# Altium schematic symbol library IC.SchLib: 555 symbols (part 5 of 15)
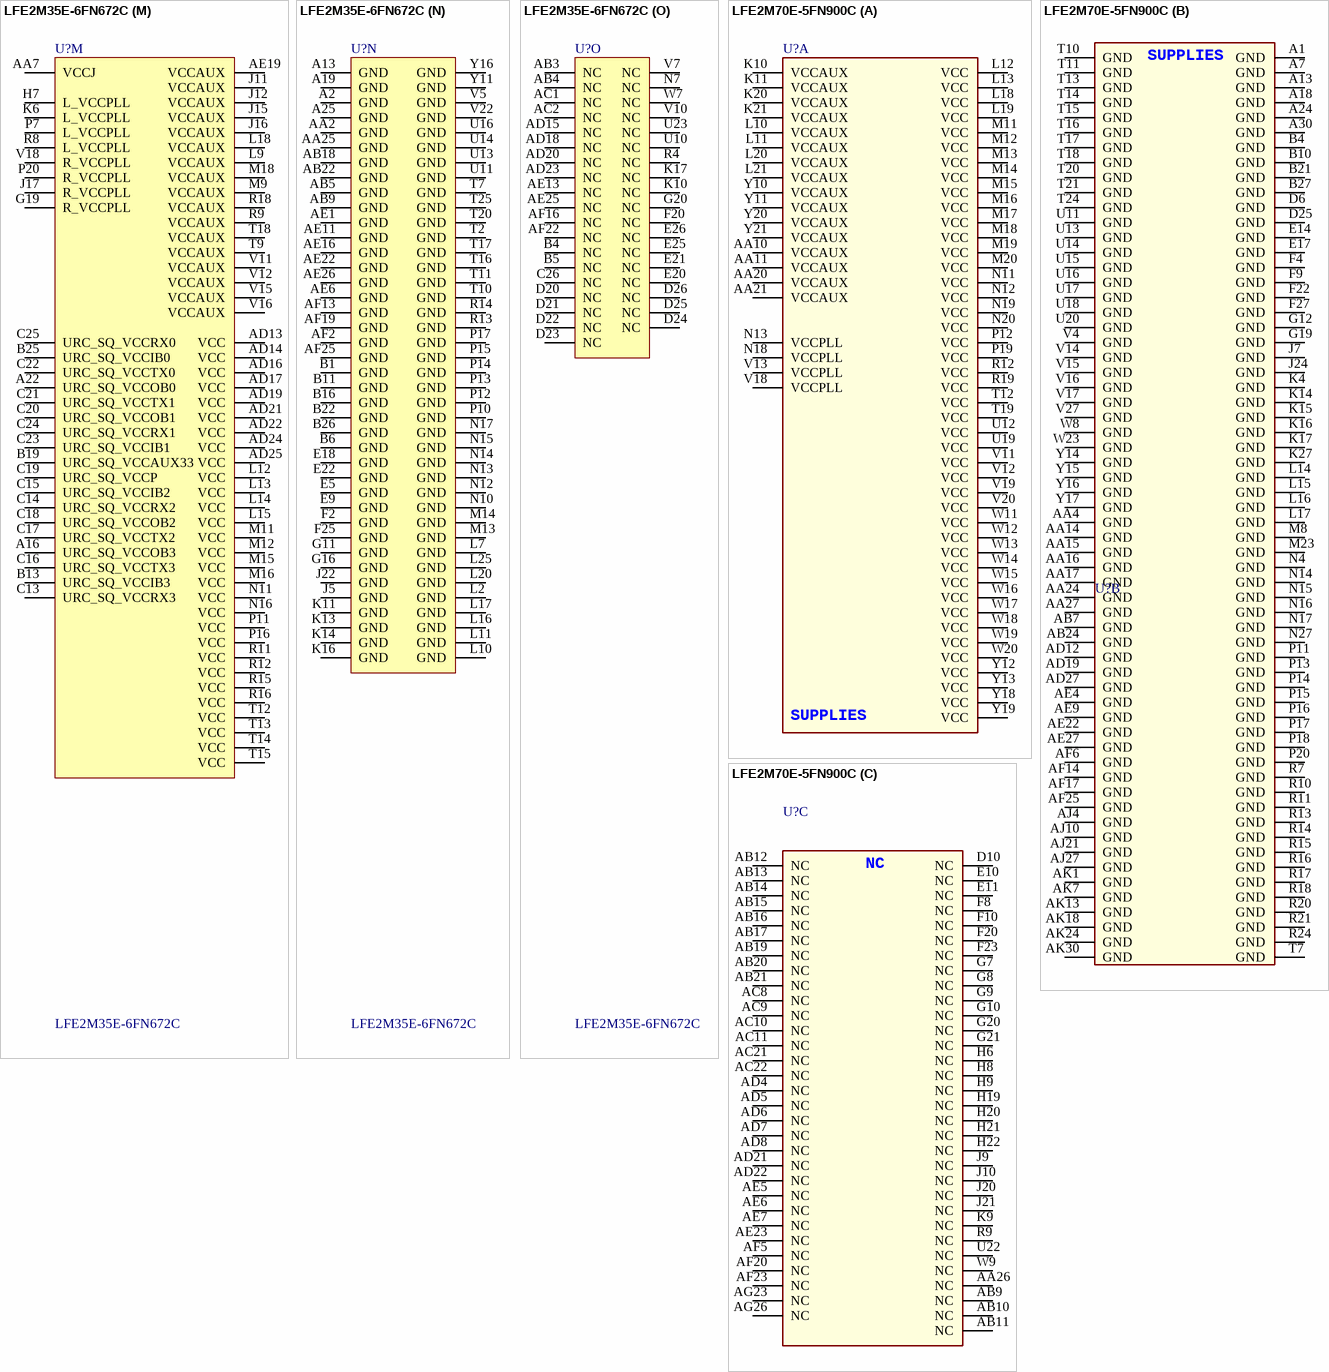
[diagram p74: symbols LFE2M35E-6FN672C to LFE2M70E-5FN900C]

## LFE2M35E-6FN672C
designator U?
ECP2M 1.2V  FPGA, 410 I/Os, 35K LUTs, 672-Ball fpBGA, Speed Grade 6, Commercial Grade, Pb-Free; Manufacturer: Lattice; Sort: 510; Tech: SMDR; Package: FPBGA672; Price: 0; Manufacturer No: LFE2M35E-6FN672C
footprint fpBGA672 (BGA, 672-Leads, Body 27x27mm, Pitch 1mm)
3D model LFE2M35E_F672 (PCB3D Model)
part A pins: A3 PT13A (io) "General-purpose user-I/O pin.", A4 PT13B (io) "General-purpose user-I/O pin.", A5 PT14A (io) "General-purpose user-I/O pin.", A6 PT14B (io) "General-purpose user-I/O pin.", A7 PT19A (io) "General-purpose user-I/O pin.", A8 PT22A (io) "General-purpose user-I/O pin.", A9 PT24B (io) "General-purpose user-I/O pin.", A10 PT32B (io) "General-purpose user-I/O pin.", A11 PT35A (io) "General-purpose user-I/O pin.", A12 PT35B (io) "General-purpose user-I/O pin.", B2 PT6B (io) "General-purpose user-I/O pin.", B3 PT7B (io) "General-purpose user-I/O pin.", B7 VCCIO0 (power) "Dedicated power supply pin for I/O bank.", B8 PT19B (io) "General-purpose user-I/O pin.", B9 PT22B (io) "General-purpose user-I/O pin.", B10 PT32A (io) "General-purpose user-I/O pin.", B12 VCCIO0 (power) "Dedicated power supply pin for I/O bank.", C3 PT4B (io) "General-purpose user-I/O pin.", C4 PT6A (io) "General-purpose user-I/O pin.", C5 PT7A (io) "General-purpose user-I/O pin.", C6 PT12B (io) "General-purpose user-I/O pin.", C7 PT17A (io) "General-purpose user-I/O pin.", C8 PT16B (io) "General-purpose user-I/O pin.", C9 PT20A (io) "General-purpose user-I/O pin.", C10 PT23B (io) "General-purpose user-I/O pin.", C11 PT36B/VREF2_0 (io) "Dual-purpose pin that is either a user-I/O pin or provides a reference voltage input for I/O bank.", C12 PT37B/PCLKC0_0 (io) "Dual-purpose pin that is either a user-I/O pin or Primary Clock pin.", D4 PT4A (io) "General-purpose user-I/O pin.", D5 PT10B (io) "General-purpose user-I/O pin.", D6 PT17B (io) "General-purpose user-I/O pin.", D7 PT11B (io) "General-purpose user-I/O pin.", D8 PT15B (io) "General-purpose user-I/O pin.", D9 PT18B (io) "General-purpose user-I/O pin.", D10 PT29B (io) "General-purpose user-I/O pin.", D11 PT31B (io) "General-purpose user-I/O pin.", D12 PT34B (io) "General-purpose user-I/O pin.", E6 PT10A (io) "General-purpose user-I/O pin.", E7 PT8A (io) "General-purpose user-I/O pin.", E8 PT23A (io) "General-purpose user-I/O pin.", E10 PT21A (io) "General-purpose user-I/O pin.", E11 PT30B (io) "General-purpose user-I/O pin.", F7 PT5A (io) "General-purpose user-I/O pin.", F8 PT3A (io) "General-purpose user-I/O pin.", F9 PT9A (io) "General-purpose user-I/O pin.", F10 PT12A (io) "General-purpose user-I/O pin.", F11 VCCIO0 (power) "Dedicated power supply pin for I/O bank.", F12 PT21B (io) "General-purpose user-I/O pin.", F13 PT30A (io) "General-purpose user-I/O pin.", F14 PT36A/VREF1_0 (io) "Dual-purpose pin that is either a user-I/O pin or provides a reference voltage input for I/O bank.", G7 PT2A (io) "General-purpose user-I/O pin.", G8 PT2B (io) "General-purpose user-I/O pin.", G9 PT5B (io) "General-purpose user-I/O pin.", G10 PT9B (io) "General-purpose user-I/O pin.", G12 PT16A (io) "General-purpose user-I/O pin.", G13 PT20B (io) "General-purpose user-I/O pin.", G14 PT31A (io) "General-purpose user-I/O pin.", G15 PT37A/PCLKT0_0 (io) "Dual-purpose pin that is either a user-I/O pin or Primary Clock pin.", H10 PT8B (io) "General-purpose user-I/O pin.", H11 PT11A (io) "General-purpose user-I/O pin.", H12 PT15A (io) "General-purpose user-I/O pin.", H13 PT18A (io) "General-purpose user-I/O pin.", H14 PT29A (io) "General-purpose user-I/O pin.", H15 PT33A (io) "General-purpose user-I/O pin.", H16 PT34A (io) "General-purpose user-I/O pin.", H18 PT33B (io) "General-purpose user-I/O pin.", J10 PT3B (io) "General-purpose user-I/O pin.", J13 VCCIO0 (power) "Dedicated power supply pin for I/O bank.", K12 VCCIO0 (power) "Dedicated power supply pin for I/O bank."
part B pins: D13 PT40A (io) "General-purpose user-I/O pin.", D14 PT40B (io) "General-purpose user-I/O pin.", D15 PT43A (io) "General-purpose user-I/O pin.", D16 PT45A (io) "General-purpose user-I/O pin.", D17 PT46A (io) "General-purpose user-I/O pin.", D18 VCCIO1 (power) "Dedicated power supply pin for I/O bank.", E12 PT39A/VREF1_1 (io) "Dual-purpose pin that is either a user-I/O pin or provides a reference voltage input for I/O bank.", E13 PT38A/PCLKT1_0 (io) "Dual-purpose pin that is either a user-I/O pin or Primary Clock pin.", E14 PT41A (io) "General-purpose user-I/O pin.", E15 PT42A (io) "General-purpose user-I/O pin.", E16 PT43B (io) "General-purpose user-I/O pin.", E17 PT46B (io) "General-purpose user-I/O pin.", F15 PT39B/VREF2_1 (io) "Dual-purpose pin that is either a user-I/O pin or provides a reference voltage input for I/O bank.", F16 VCCIO1 (power) "Dedicated power supply pin for I/O bank.", F17 PT45B (io) "General-purpose user-I/O pin.", F18 PT44A (io) "General-purpose user-I/O pin.", F19 PT44B (io) "General-purpose user-I/O pin.", G17 PT41B (io) "General-purpose user-I/O pin.", G18 PT42B (io) "General-purpose user-I/O pin.", H17 PT38B/PCLKC1_0 (io) "Dual-purpose pin that is either a user-I/O pin or Primary Clock pin.", J14 VCCIO1 (power) "Dedicated power supply pin for I/O bank.", K15 VCCIO1 (power) "Dedicated power supply pin for I/O bank."
part C pins: E23 PR9A/VREF1_2 (io) "Dual-purpose pin that is either a user-I/O pin or provides a reference voltage input for I/O bank.", E24 PR9B/VREF2_2 (io) "Dual-purpose pin that is either a user-I/O pin or provides a reference voltage input for I/O bank.", F21 PR12A/URM0_SPLLT_FB_A (io) "Dual-purpose pin that is either a user-I/O pin or Optional feedback SPLL input pin.", F22 PR14A (io) "General-purpose user-I/O pin.", F23 PR13B (io) "General-purpose user-I/O pin.", F24 PR13A (io) "General-purpose user-I/O pin.", F26 PR11A/URM0_SPLLT_IN_A (io) "Dual-purpose pin that is either a user-I/O pin or SPLL input pin.", G21 PR19B (io) "General-purpose user-I/O pin.", G22 PR16B (io) "General-purpose user-I/O pin.", G23 PR15A/RDQS15 (io) "Dual-purpose pin that is either a user-I/O pin or DQS input pin.", G24 PR15B (io) "General-purpose user-I/O pin.", G25 VCCIO2 (power) "Dedicated power supply pin for I/O bank.", G26 PR11B/URM0_SPLLC_IN_A (io) "Dual-purpose pin that is either a user-I/O pin or SPLL input pin.", H20 PR12B/URM0_SPLLC_FB_A (io) "Dual-purpose pin that is either a user-I/O pin or Optional feedback SPLL input pin.", H21 PR22B (io) "General-purpose user-I/O pin.", H22 PR21B (io) "General-purpose user-I/O pin.", H23 PR18B (io) "General-purpose user-I/O pin.", H24 PR18A (io) "General-purpose user-I/O pin.", H25 PR17B (io) "General-purpose user-I/O pin.", H26 PR17A (io) "General-purpose user-I/O pin.", J18 PR14B (io) "General-purpose user-I/O pin.", J19 PR19A (io) "General-purpose user-I/O pin.", J20 PR21A (io) "General-purpose user-I/O pin.", J21 PR23A/RDQS23 (io) "Dual-purpose pin that is either a user-I/O pin or DQS input pin.", J23 PR24B (io) "General-purpose user-I/O pin.", J24 PR24A (io) "General-purpose user-I/O pin.", J25 PR20B (io) "General-purpose user-I/O pin.", J26 PR20A (io) "General-purpose user-I/O pin.", K18 PR22A (io) "General-purpose user-I/O pin.", K19 PR16A (io) "General-purpose user-I/O pin.", K20 PR23B (io) "General-purpose user-I/O pin.", K21 PR25A (io) "General-purpose user-I/O pin.", K22 PR29B/URM1_SPLLC_FB_A (io) "Dual-purpose pin that is either a user-I/O pin or Optional feedback SPLL input pin.", K23 PR26A (io) "General-purpose user-I/O pin.", K24 PR26B (io) "General-purpose user-I/O pin.", K25 PR28B/URM1_SPLLC_IN_A (io) "Dual-purpose pin that is either a user-I/O pin or SPLL input pin.", K26 PR28A/URM1_SPLLT_IN_A (io) "Dual-purpose pin that is either a user-I/O pin or SPLL input pin.", L19 PR25B (io) "General-purpose user-I/O pin.", L21 VCCIO2 (power) "Dedicated power supply pin for I/O bank.", L22 PR32B (io) "General-purpose user-I/O pin.", L23 PR31B (io) "General-purpose user-I/O pin.", L24 PR32A/RDQS32 (io) "Dual-purpose pin that is either a user-I/O pin or DQS input pin.", L26 PR30A (io) "General-purpose user-I/O pin.", M17 VCCIO2 (power) "Dedicated power supply pin for I/O bank.", M19 PR29A/URM1_SPLLT_FB_A (io) "Dual-purpose pin that is either a user-I/O pin or Optional feedback SPLL input pin.", M20 PR31A (io) "General-purpose user-I/O pin.", M22 PR34B (io) "General-purpose user-I/O pin.", M23 PR33B (io) "General-purpose user-I/O pin.", M24 PR34A (io) "General-purpose user-I/O pin.", M25 VCCIO2 (power) "Dedicated power supply pin for I/O bank.", M26 PR30B (io) "General-purpose user-I/O pin.", N18 VCCIO2 (power) "Dedicated power supply pin for I/O bank.", N24 PR35B/PCLKC2_0 (io) "Dual-purpose pin that is either a user-I/O pin or Primary Clock pin.", N25 PR35A/PCLKT2_0 (io) "Dual-purpose pin that is either a user-I/O pin or Primary Clock pin.", N26 PR33A (io) "General-purpose user-I/O pin."
part D pins: AA26 PR59B/LRM0_GDLLC_IN_A (io) "Dual-purpose pin that is either a user-I/O pin or DLL input pin.", M21 PR37B/PCLKC3_0 (io) "Dual-purpose pin that is either a user-I/O pin or Primary Clock pin.", N19 PR42A/LRM2_SPLLT_FB_A (io) "Dual-purpose pin that is either a user-I/O pin or Optional feedback SPLL input pin.", N20 PR39B (io) "General-purpose user-I/O pin.", N21 PR40B (io) "General-purpose user-I/O pin.", N22 PR39A (io) "General-purpose user-I/O pin.", N23 PR37A/PCLKT3_0 (io) "Dual-purpose pin that is either a user-I/O pin or Primary Clock pin.", P18 VCCIO3 (power) "Dedicated power supply pin for I/O bank.", P19 PR45A (io) "General-purpose user-I/O pin.", P21 PR45B (io) "General-purpose user-I/O pin.", P22 PR40A (io) "General-purpose user-I/O pin.", P23 PR41B/LRM2_SPLLC_IN_A (io) "Dual-purpose pin that is either a user-I/O pin or SPLL input pin.", P24 PR41A/LRM2_SPLLT_IN_A (io) "Dual-purpose pin that is either a user-I/O pin or SPLL input pin.", P25 PR38B/VREF2_3 (io) "Dual-purpose pin that is either a user-I/O pin or provides a reference voltage input for I/O bank.", P26 PR38A/VREF1_3 (io) "Dual-purpose pin that is either a user-I/O pin or provides a reference voltage input for I/O bank.", R17 VCCIO3 (power) "Dedicated power supply pin for I/O bank.", R19 PR48A/RDQS48 (io) "Dual-purpose pin that is either a user-I/O pin or DQS input pin.", R20 PR47A (io) "General-purpose user-I/O pin.", R21 PR47B (io) "General-purpose user-I/O pin.", R22 PR42B/LRM2_SPLLC_FB_A (io) "Dual-purpose pin that is either a user-I/O pin or Optional feedback SPLL input pin.", R23 PR44B (io) "General-purpose user-I/O pin.", R24 PR44A (io) "General-purpose user-I/O pin.", R25 VCCIO3 (power) "Dedicated power supply pin for I/O bank.", R26 PR46A (io) "General-purpose user-I/O pin.", T19 PR48B (io) "General-purpose user-I/O pin.", T21 VCCIO3 (power) "Dedicated power supply pin for I/O bank.", T22 PR50B (io) "General-purpose user-I/O pin.", T23 PR50A (io) "General-purpose user-I/O pin.", T24 PR51A (io) "General-purpose user-I/O pin.", T26 PR46B (io) "General-purpose user-I/O pin.", U18 PR54B (io) "General-purpose user-I/O pin.", U19 PR60A/LRM0_GDLLT_FB_A (io) "Dual-purpose pin that is either a user-I/O pin or Optional feedback DPLL input pin.", U20 PR58A/LRM0_GPLLT_IN_A (io) "Dual-purpose pin that is either a user-I/O pin or GPLL input pin.", U21 PR56A (io) "General-purpose user-I/O pin.", U22 PR54A (io) "General-purpose user-I/O pin.", U24 PR51B (io) "General-purpose user-I/O pin.", U25 PR49B (io) "General-purpose user-I/O pin.", U26 PR49A (io) "General-purpose user-I/O pin.", V21 PR60B/LRM0_GDLLC_FB_A (io) "Dual-purpose pin that is either a user-I/O pin or Optional feedback DPLL input pin.", V23 PR58B/LRM0_GPLLC_IN_A (io) "Dual-purpose pin that is either a user-I/O pin or GPLL input pin.", V24 PR57A/LRM0_GPLLT_FB_A/RDQS57 (io) "Multi-purpose pin that is either a user-I/O pin, Optional feedback GPLL input pin or DQS input pin.", V25 PR53B (io) "General-purpose user-I/O pin.", V26 PR53A (io) "General-purpose user-I/O pin.", W24 PR57B/LRM0_GPLLC_FB_A (io) "Dual-purpose pin that is either a user-I/O pin or Optional feedback GPLL input pin.", W25 PR55B (io) "General-purpose user-I/O pin.", W26 PR55A (io) "General-purpose user-I/O pin.", Y25 VCCIO3 (power) "Dedicated power supply pin for I/O bank.", Y26 PR59A/LRM0_GDLLT_IN_A (io) "Dual-purpose pin that is either a user-I/O pin or DLL input pin."
part E pins: AA14 PB42B (io) "General-purpose user-I/O pin.", AA15 PB51A/BDQS51 (io) "Dual-purpose pin that is either a user-I/O pin or DQS input pin.", AA16 VCCIO4 (power) "Dedicated power supply pin for I/O bank.", AA17 PB60A/BDQS60 (io) "Dual-purpose pin that is either a user-I/O pin or DQS input pin.", AA18 PB61A (io) "General-purpose user-I/O pin.", AA19 PB65B (io) "General-purpose user-I/O pin.", AA20 PB73B (io) "General-purpose user-I/O pin.", AB14 PB42A/BDQS42 (io) "Dual-purpose pin that is either a user-I/O pin or DQS input pin.", AB15 PB49A (io) "General-purpose user-I/O pin.", AB16 PB50B (io) "General-purpose user-I/O pin.", AB17 PB54B (io) "General-purpose user-I/O pin.", AB19 PB59A (io) "General-purpose user-I/O pin.", AB20 PB57A (io) "General-purpose user-I/O pin.", AB21 PB69B (io) "General-purpose user-I/O pin.", AC13 PB40A/PCLKT4_0 (io) "Dual-purpose pin that is either a user-I/O pin or Primary Clock pin.", AC14 PB41B/VREF1_4 (io) "Dual-purpose pin that is either a user-I/O pin or provides a reference voltage input for I/O bank.", AC15 PB48A (io) "General-purpose user-I/O pin.", AC16 PB49B (io) "General-purpose user-I/O pin.", AC17 PB52B (io) "General-purpose user-I/O pin.", AC18 VCCIO4 (power) "Dedicated power supply pin for I/O bank.", AC19 PB57B (io) "General-purpose user-I/O pin.", AC20 PB58A (io) "General-purpose user-I/O pin.", AC21 PB63A (io) "General-purpose user-I/O pin.", AC22 PB69A/BDQS69 (io) "Dual-purpose pin that is either a user-I/O pin or DQS input pin.", AC23 PB71A (io) "General-purpose user-I/O pin.", AC25 PB71B (io) "General-purpose user-I/O pin.", AD26 PB70B (io) "General-purpose user-I/O pin.", AE14 PB41A/VREF2_4 (io) "Dual-purpose pin that is either a user-I/O pin or provides a reference voltage input for I/O bank.", AE15 PB48B (io) "General-purpose user-I/O pin.", AE17 PB50A (io) "General-purpose user-I/O pin.", AE18 PB53B (io) "General-purpose user-I/O pin.", AE20 PB55B (io) "General-purpose user-I/O pin.", AE21 PB63B (io) "General-purpose user-I/O pin.", AE23 PB66B (io) "General-purpose user-I/O pin.", AE24 PB67B (io) "General-purpose user-I/O pin.", AF14 PB47A (io) "General-purpose user-I/O pin.", AF15 PB47B (io) "General-purpose user-I/O pin.", AF17 PB51B (io) "General-purpose user-I/O pin.", AF18 PB53A (io) "General-purpose user-I/O pin.", AF20 PB55A (io) "General-purpose user-I/O pin.", AF21 PB62A (io) "General-purpose user-I/O pin.", AF23 PB64A (io) "General-purpose user-I/O pin.", AF24 PB67A (io) "General-purpose user-I/O pin.", U15 VCCIO4 (power) "Dedicated power supply pin for I/O bank.", V14 VCCIO4 (power) "Dedicated power supply pin for I/O bank.", V17 PB73A (io) "General-purpose user-I/O pin.", W15 PB54A (io) "General-purpose user-I/O pin.", W16 PB59B (io) "General-purpose user-I/O pin.", W17 PB65A (io) "General-purpose user-I/O pin.", W20 PB72B (io) "General-purpose user-I/O pin.", Y14 PB40B/PCLKC4_0 (io) "Dual-purpose pin that is either a user-I/O pin or Primary Clock pin.", Y15 PB52A (io) "General-purpose user-I/O pin.", Y17 PB61B (io) "General-purpose user-I/O pin.", Y18 PB68B (io) "General-purpose user-I/O pin."
part F pins: AA8 PB4B (io) "General-purpose user-I/O pin.", AA9 PB8A (io) "General-purpose user-I/O pin.", AA10 PB14A (io) "General-purpose user-I/O pin.", AA11 VCCIO5 (power) "Dedicated power supply pin for I/O bank.", AA12 PB21B (io) "General-purpose user-I/O pin.", AA13 PB33A/BDQS33 (io) "Dual-purpose pin that is either a user-I/O pin or DQS input pin.", AB6 PB2A (io) "General-purpose user-I/O pin.", AB7 PB6A/BDQS6 (io) "Dual-purpose pin that is either a user-I/O pin or DQS input pin.", AB8 PB12B (io) "General-purpose user-I/O pin.", AB10 PB16B (io) "General-purpose user-I/O pin.", AB11 PB19B (io) "General-purpose user-I/O pin.", AB12 PB24B (io) "General-purpose user-I/O pin.", AB13 PB33B (io) "General-purpose user-I/O pin.", AC5 PB4A (io) "General-purpose user-I/O pin.", AC6 PB5A (io) "General-purpose user-I/O pin.", AC7 PB9A (io) "General-purpose user-I/O pin.", AC8 PB14B (io) "General-purpose user-I/O pin.", AC9 PB15B (io) "General-purpose user-I/O pin.", AC10 PB23B (io) "General-purpose user-I/O pin.", AC11 PB24A/BDQS24 (io) "Dual-purpose pin that is either a user-I/O pin or DQS input pin.", AC12 PB34B/VREF1_5 (io) "Dual-purpose pin that is either a user-I/O pin or provides a reference voltage input for I/O bank.", AD1 PB3A (io) "General-purpose user-I/O pin.", AD2 PB3B (io) "General-purpose user-I/O pin.", AD3 PB7A (io) "General-purpose user-I/O pin.", AD4 PB7B (io) "General-purpose user-I/O pin.", AD5 PB10B (io) "General-purpose user-I/O pin.", AD6 PB13B (io) "General-purpose user-I/O pin.", AD7 PB20A (io) "General-purpose user-I/O pin.", AD8 PB21A (io) "General-purpose user-I/O pin.", AD9 PB23A (io) "General-purpose user-I/O pin.", AD10 PB25A (io) "General-purpose user-I/O pin.", AD11 PB28A (io) "General-purpose user-I/O pin.", AD12 PB35B/PCLKC5_0 (io) "Dual-purpose pin that is either a user-I/O pin or Primary Clock pin.", AE2 PB10A (io) "General-purpose user-I/O pin.", AE3 PB11B (io) "General-purpose user-I/O pin.", AE4 PB11A (io) "General-purpose user-I/O pin.", AE5 PB13A (io) "General-purpose user-I/O pin.", AE7 VCCIO5 (power) "Dedicated power supply pin for I/O bank.", AE8 PB22A (io) "General-purpose user-I/O pin.", AE9 PB26B (io) "General-purpose user-I/O pin.", AE10 PB27B (io) "General-purpose user-I/O pin.", AE12 VCCIO5 (power) "Dedicated power supply pin for I/O bank.", AF3 PB17A (io) "General-purpose user-I/O pin.", AF4 PB17B (io) "General-purpose user-I/O pin.", AF5 PB18A (io) "General-purpose user-I/O pin.", AF6 PB18B (io) "General-purpose user-I/O pin.", AF7 PB20B (io) "General-purpose user-I/O pin.", AF8 PB22B (io) "General-purpose user-I/O pin.", AF9 PB26A (io) "General-purpose user-I/O pin.", AF10 PB27A (io) "General-purpose user-I/O pin.", AF11 PB28B (io) "General-purpose user-I/O pin.", AF12 PB35A/PCLKT5_0 (io) "Dual-purpose pin that is either a user-I/O pin or Primary Clock pin.", U12 VCCIO5 (power) "Dedicated power supply pin for I/O bank.", V13 VCCIO5 (power) "Dedicated power supply pin for I/O bank.", W9 PB5B (io) "General-purpose user-I/O pin.", W10 PB8B (io) "General-purpose user-I/O pin.", W11 PB12A (io) "General-purpose user-I/O pin.", W12 PB15A/BDQS15 (io) "Dual-purpose pin that is either a user-I/O pin or DQS input pin.", W13 PB16A (io) "General-purpose user-I/O pin.", W14 PB34A/VREF2_5 (io) "Dual-purpose pin that is either a user-I/O pin or provides a reference voltage input for I/O bank.", Y8 PB2B (io) "General-purpose user-I/O pin.", Y9 PB6B (io) "General-purpose user-I/O pin.", Y10 PB9B (io) "General-purpose user-I/O pin.", Y12 PB19A (io) "General-purpose user-I/O pin.", Y13 PB25B (io) "General-purpose user-I/O pin."
part G pins: AA1 PL59A/LLM0_GDLLT_IN_A (io) "Dual-purpose pin that is either a user-I/O pin or DLL input pin.", AA3 PL64B (io) "General-purpose user-I/O pin.", AA4 PL66B (io) "General-purpose user-I/O pin.", AA5 PL68A (io) "General-purpose user-I/O pin.", AA6 PL68B (io) "General-purpose user-I/O pin.", AB1 PL59B/LLM0_GDLLC_IN_A (io) "Dual-purpose pin that is either a user-I/O pin or DLL input pin.", AB2 PL66A/LDQS66 (io) "Dual-purpose pin that is either a user-I/O pin or DQS input pin.", N6 PL38B/VREF1_6 (io) "Dual-purpose pin that is either a user-I/O pin or provides a reference voltage input for I/O bank.", N8 PL42A/LLM2_SPLLT_FB_A (io) "Dual-purpose pin that is either a user-I/O pin or Optional feedback SPLL input pin.", P1 PL41A/LLM2_SPLLT_IN_A (io) "Dual-purpose pin that is either a user-I/O pin or SPLL input pin.", P2 PL37B/PCLKC6_0 (io) "Dual-purpose pin that is either a user-I/O pin or Primary Clock pin.", P3 PL37A/PCLKT6_0 (io) "Dual-purpose pin that is either a user-I/O pin or Primary Clock pin.", P4 PL39A (io) "General-purpose user-I/O pin.", P5 PL38A/VREF2_6 (io) "Dual-purpose pin that is either a user-I/O pin or provides a reference voltage input for I/O bank.", P6 PL40A (io) "General-purpose user-I/O pin.", P8 PL45A (io) "General-purpose user-I/O pin.", P9 VCCIO6 (power) "Dedicated power supply pin for I/O bank.", R1 PL41B/LLM2_SPLLC_IN_A (io) "Dual-purpose pin that is either a user-I/O pin or SPLL input pin.", R2 VCCIO6 (power) "Dedicated power supply pin for I/O bank.", R3 PL39B (io) "General-purpose user-I/O pin.", R5 PL42B/LLM2_SPLLC_FB_A (io) "Dual-purpose pin that is either a user-I/O pin or Optional feedback SPLL input pin.", R6 PL45B (io) "General-purpose user-I/O pin.", R7 PL47A (io) "General-purpose user-I/O pin.", R10 VCCIO6 (power) "Dedicated power supply pin for I/O bank.", T1 PL46A (io) "General-purpose user-I/O pin.", T3 PL44A (io) "General-purpose user-I/O pin.", T4 PL44B (io) "General-purpose user-I/O pin.", T5 PL47B (io) "General-purpose user-I/O pin.", T6 VCCIO6 (power) "Dedicated power supply pin for I/O bank.", U1 PL46B (io) "General-purpose user-I/O pin.", U2 PL50A (io) "General-purpose user-I/O pin.", U3 PL48A/LDQS48 (io) "Dual-purpose pin that is either a user-I/O pin or DQS input pin.", U4 PL48B (io) "General-purpose user-I/O pin.", U5 PL49A (io) "General-purpose user-I/O pin.", U6 PL49B (io) "General-purpose user-I/O pin.", U7 PL60A/LLM0_GDLLT_FB_A (io) "Dual-purpose pin that is either a user-I/O pin or Optional feedback DPLL input pin.", U8 PL63A (io) "General-purpose user-I/O pin.", U9 PL67B (io) "General-purpose user-I/O pin.", V1 PL50B (io) "General-purpose user-I/O pin.", V2 PL51B (io) "General-purpose user-I/O pin.", V3 PL55B (io) "General-purpose user-I/O pin.", V4 PL55A (io) "General-purpose user-I/O pin.", V6 PL60B/LLM0_GDLLC_FB_A (io) "Dual-purpose pin that is either a user-I/O pin or Optional feedback DPLL input pin.", V9 PL69B (io) "General-purpose user-I/O pin.", W1 PL58A/LLM0_GPLLT_FB_A (io) "Dual-purpose pin that is either a user-I/O pin or Optional feedback GPLL input pin.", W2 PL51A (io) "General-purpose user-I/O pin.", W3 PL57B/LLM0_GPLLC_IN_A (io) "Dual-purpose pin that is either a user-I/O pin or GPLL input pin.", W4 PL57A/LLM0_GPLLT_IN_A/LDQS57 (io) "Multi-purpose pin that is either a user-I/O pin, GPLL input pin or DQS input pin.", W5 PL62A (io) "General-purpose user-I/O pin.", W6 PL63B (io) "General-purpose user-I/O pin.", Y1 PL58B/LLM0_GPLLC_FB_A (io) "Dual-purpose pin that is either a user-I/O pin or Optional feedback GPLL input pin.", Y2 VCCIO6 (power) "Dedicated power supply pin for I/O bank.", Y3 PL64A (io) "General-purpose user-I/O pin.", Y4 PL62B (io) "General-purpose user-I/O pin.", Y5 PL65B (io) "General-purpose user-I/O pin.", Y6 PL67A (io) "General-purpose user-I/O pin.", Y7 PL69A (io) "General-purpose user-I/O pin."
part H pins: C1 PL2B (io) "General-purpose user-I/O pin.", C2 PL2A (io) "General-purpose user-I/O pin.", D1 PL8B (io) "General-purpose user-I/O pin.", D2 PL4B (io) "General-purpose user-I/O pin.", D3 PL4A (io) "General-purpose user-I/O pin.", E1 PL8A (io) "General-purpose user-I/O pin.", E2 PL6B (io) "General-purpose user-I/O pin.", E3 PL6A/LDQS6 (io) "Dual-purpose pin that is either a user-I/O pin or DQS input pin.", E4 PL7B (io) "General-purpose user-I/O pin.", F1 PL11B/ULM0_SPLLC_IN_A (io) "Dual-purpose pin that is either a user-I/O pin or SPLL input pin.", F3 PL11A/ULM0_SPLLT_IN_A (io) "Dual-purpose pin that is either a user-I/O pin or SPLL input pin.", F4 PL9B/VREF1_7 (io) "Dual-purpose pin that is either a user-I/O pin or provides a reference voltage input for I/O bank.", F5 PL5A (io) "General-purpose user-I/O pin.", F6 PL3A (io) "General-purpose user-I/O pin.", G1 PL19A (io) "General-purpose user-I/O pin.", G2 VCCIO7 (power) "Dedicated power supply pin for I/O bank.", G3 PL17B (io) "General-purpose user-I/O pin.", G4 PL13B (io) "General-purpose user-I/O pin.", G5 PL13A (io) "General-purpose user-I/O pin.", G6 PL12A/ULM0_SPLLT_FB_A (io) "Dual-purpose pin that is either a user-I/O pin or Optional feedback SPLL input pin.", H1 PL19B (io) "General-purpose user-I/O pin.", H2 PL21A (io) "General-purpose user-I/O pin.", H3 PL17A (io) "General-purpose user-I/O pin.", H4 PL16B (io) "General-purpose user-I/O pin.", H5 PL14A (io) "General-purpose user-I/O pin.", H6 PL14B (io) "General-purpose user-I/O pin.", H8 PL5B (io) "General-purpose user-I/O pin.", H9 PL3B (io) "General-purpose user-I/O pin.", J1 PL26A (io) "General-purpose user-I/O pin.", J2 PL21B (io) "General-purpose user-I/O pin.", J3 PL20A (io) "General-purpose user-I/O pin.", J4 PL20B (io) "General-purpose user-I/O pin.", J6 PL22B (io) "General-purpose user-I/O pin.", J7 PL16A (io) "General-purpose user-I/O pin.", J8 PL9A/VREF2_7 (io) "Dual-purpose pin that is either a user-I/O pin or provides a reference voltage input for I/O bank.", J9 PL7A (io) "General-purpose user-I/O pin.", K1 PL28A/ULM1_SPLLT_IN_A (io) "Dual-purpose pin that is either a user-I/O pin or SPLL input pin.", K2 PL26B (io) "General-purpose user-I/O pin.", K3 PL25A (io) "General-purpose user-I/O pin.", K4 PL24A (io) "General-purpose user-I/O pin.", K5 PL23A/LDQS23 (io) "Dual-purpose pin that is either a user-I/O pin or DQS input pin.", K7 PL22A (io) "General-purpose user-I/O pin.", K8 PL29A/ULM1_SPLLT_FB_A (io) "Dual-purpose pin that is either a user-I/O pin or Optional feedback SPLL input pin.", K9 PL12B/ULM0_SPLLC_FB_A (io) "Dual-purpose pin that is either a user-I/O pin or Optional feedback SPLL input pin.", L1 PL28B/ULM1_SPLLC_IN_A (io) "Dual-purpose pin that is either a user-I/O pin or SPLL input pin.", L3 PL25B (io) "General-purpose user-I/O pin.", L4 PL24B (io) "General-purpose user-I/O pin.", L5 PL23B (io) "General-purpose user-I/O pin.", L6 VCCIO7 (power) "Dedicated power supply pin for I/O bank.", L8 PL31A (io) "General-purpose user-I/O pin.", M1 PL32A/LDQS32 (io) "Dual-purpose pin that is either a user-I/O pin or DQS input pin.", M2 VCCIO7 (power) "Dedicated power supply pin for I/O bank.", M3 PL30B (io) "General-purpose user-I/O pin.", M4 PL30A (io) "General-purpose user-I/O pin.", M5 PL29B/ULM1_SPLLC_FB_A (io) "Dual-purpose pin that is either a user-I/O pin or Optional feedback SPLL input pin.", M6 PL31B (io) "General-purpose user-I/O pin.", M7 PL35A/PCLKT7_0 (io) "Dual-purpose pin that is either a user-I/O pin or Primary Clock pin.", M8 PL35B/PCLKC7_0 (io) "Dual-purpose pin that is either a user-I/O pin or Primary Clock pin.", M10 VCCIO7 (power) "Dedicated power supply pin for I/O bank.", N1 PL32B (io) "General-purpose user-I/O pin.", N2 PL33B (io) "General-purpose user-I/O pin.", N3 PL33A (io) "General-purpose user-I/O pin.", N4 PL34B (io) "General-purpose user-I/O pin.", N5 PL34A (io) "General-purpose user-I/O pin.", N9 VCCIO7 (power) "Dedicated power supply pin for I/O bank."
part I pins: AA24 PR64A/D6 (io) "Dual-purpose pin that is either a user-I/O pin or sysCONFIG Port Data I/O.", AB26 PR67B/CSN (io) "Dual-purpose configuration pin. sysCONFIG chip select and available as a user-I/O pin.", AC24 VCCIO8 (power) "Dedicated power supply pin for I/O bank.", U17 VCCIO8 (power) "Dedicated power supply pin for I/O bank.", V20 PR63A/DI (io) "Dual-purpose pin that is either a user-I/O pin or Input for serial configuration data when using sysCONFIG port.", W18 PR65A/D4 (io) "Dual-purpose pin that is either a user-I/O pin or sysCONFIG Port Data I/O.", W19 PR66B/D1 (io) "Dual-purpose pin that is either a user-I/O pin or sysCONFIG Port Data I/O.", W21 PR63B/D7 (io) "Dual-purpose pin that is either a user-I/O pin or sysCONFIG Port Data I/O.", W22 PR65B/D3 (io) "Dual-purpose pin that is either a user-I/O pin or sysCONFIG Port Data I/O.", W23 PR62B/DOUT/CSON (io) "Dual-purpose configuration pin. Output for serial configuration data and available as a user-I/O pin.", Y19 PR68B/WRITEN (io) "Dual-purpose configuration pin. Write Data on Parallel port and available as a user-I/O pin.", Y20 PR66A/D2 (io) "Dual-purpose pin that is either a user-I/O pin or sysCONFIG Port Data I/O.", Y21 PR68A/CS1N (io) "Dual-purpose configuration pin. sysCONFIG chip select and available as a user-I/O pin.", Y22 PR67A/D0 (io) "Dual-purpose pin that is either a user-I/O pin or sysCONFIG Port Data I/O.", Y23 PR64B/D5 (io) "Dual-purpose pin that is either a user-I/O pin or sysCONFIG Port Data I/O.", Y24 PR62A/BUSY (io) "Dual-purpose configuration pin. Read control command in SPI3 or SPIX mode and available as a user-I/O."
part J pins: H19 XRES "10K ohm +/-1% resistor must be connected between this pin and ground.", T8 LLM0_PLLCAP "External capacitor connection for PLL.", V19 LRM0_PLLCAP "External capacitor connection for PLL."
part K pins: AA21 CFG2 (in) "Dedicated configuration pin. Specifies configuration mode values latched on rising edge of INITN.", AA22 CFG1 (in) "Dedicated configuration pin. Specifies configuration mode values latched on rising edge of INITN.", AA23 INITN (io) "Dedicated configuration pin. Indicates FPGA ready to be configured.", AB23 CFG0 (in) "Dedicated configuration pin. Specifies configuration mode values latched on rising edge of INITN.", AB24 CCLK (io) "Configuration Clock for configuring an FPGA in sysCONFIG mode.", AB25 DONE (io) "Dedicated configuration pin. Indicates configuration sequence complete & startup sequence in progress.", AC3 TCK (in) "Dedicated JTAG pin. Test Clock.", AC4 TMS (in) "Dedicated JTAG pin. Test Mode Select", AC26 PROGRAMN (in) "Dedicated configuration pin. Initiates configuration sequence when asserted low.", V8 TDO (out) "Dedicated JTAG pin. Test Data Output.", W8 TDI (in) "Dedicated JTAG pin. Test Data Input."
part L pins: A14 URC_SQ_HDINP3 (in) "Dedicated SERDES pin. High-speed input, positive channel.", A15 URC_SQ_HDINP2 (in) "Dedicated SERDES pin. High-speed input, positive channel.", A17 URC_SQ_HDOUTP3 (out) "Dedicated SERDES pin. High-speed output, positive channel.", A18 URC_SQ_HDOUTP2 (out) "Dedicated SERDES pin. High-speed output, positive channel.", A20 URC_SQ_HDOUTP1 (out) "Dedicated SERDES pin. High-speed output, positive channel.", A21 URC_SQ_HDOUTP0 (out) "Dedicated SERDES pin. High-speed output, positive channel.", A23 URC_SQ_HDINP1 (in) "Dedicated SERDES pin. High-speed input, positive channel.", A24 URC_SQ_HDINP0 (in) "Dedicated SERDES pin. High-speed input, positive channel.", B14 URC_SQ_HDINN3 (in) "Dedicated SERDES pin. High-speed input, negative channel.", B15 URC_SQ_HDINN2 (in) "Dedicated SERDES pin. High-speed input, negative channel.", B17 URC_SQ_HDOUTN3 (out) "Dedicated SERDES pin. High-speed output, negative channel.", B18 URC_SQ_HDOUTN2 (out) "Dedicated SERDES pin. High-speed output, negative channel.", B20 URC_SQ_HDOUTN1 (out) "Dedicated SERDES pin. High-speed output, negative channel.", B21 URC_SQ_HDOUTN0 (out) "Dedicated SERDES pin. High-speed output, negative channel.", B23 URC_SQ_HDINN1 (in) "Dedicated SERDES pin. High-speed input, negative channel.", B24 URC_SQ_HDINN0 (in) "Dedicated SERDES pin. High-speed input, negative channel.", D19 URC_SQ_REFCLKP (in) "Dedicated SERDES pin. Positive Reference Clock Input.", E19 URC_SQ_REFCLKN (in) "Dedicated SERDES pin. Negative Reference Clock Input."
part M pins: A16 URC_SQ_VCCOB3 (power) "Dedicated SERDES pin. Output buffer power supply.", A22 URC_SQ_VCCOB0 (power) "Dedicated SERDES pin. Output buffer power supply.", AA7 VCCJ (power) "Power supply for JTAG Test Access Port.", AD13 VCC (power) "Dedicated core logic power supply pin.", AD14 VCC (power) "Dedicated core logic power supply pin.", AD16 VCC (power) "Dedicated core logic power supply pin.", AD17 VCC (power) "Dedicated core logic power supply pin.", AD19 VCC (power) "Dedicated core logic power supply pin.", AD21 VCC (power) "Dedicated core logic power supply pin.", AD22 VCC (power) "Dedicated core logic power supply pin.", AD24 VCC (power) "Dedicated core logic power supply pin.", AD25 VCC (power) "Dedicated core logic power supply pin.", AE19 VCCAUX (power) "Dedicated auxiliary power supply pin.", B13 URC_SQ_VCCIB3 (power) "Dedicated SERDES pin. Input buffer power supply.", B19 URC_SQ_VCCAUX33 (power) "Dedicated SERDES pin. Termination resistor switching power.", B25 URC_SQ_VCCIB0 (power) "Dedicated SERDES pin. Input buffer power supply.", C13 URC_SQ_VCCRX3 (power) "Dedicated SERDES pin. Receiver power supply.", C14 URC_SQ_VCCRX2 (power) "Dedicated SERDES pin. Receiver power supply.", C15 URC_SQ_VCCIB2 (power) "Dedicated SERDES pin. Input buffer power supply.", C16 URC_SQ_VCCTX3 (power) "Dedicated SERDES pin. Transmitter power supply.", C17 URC_SQ_VCCTX2 (power) "Dedicated SERDES pin. Transmitter power supply.", C18 URC_SQ_VCCOB2 (power) "Dedicated SERDES pin. Output buffer power supply.", C19 URC_SQ_VCCP (power) "Dedicated SERDES pin. PLL and Reference clock buffer power.", C20 URC_SQ_VCCOB1 (power) "Dedicated SERDES pin. Output buffer power supply.", C21 URC_SQ_VCCTX1 (power) "Dedicated SERDES pin. Transmitter power supply.", C22 URC_SQ_VCCTX0 (power) "Dedicated SERDES pin. Transmitter power supply.", C23 URC_SQ_VCCIB1 (power) "Dedicated SERDES pin. Input buffer power supply.", C24 URC_SQ_VCCRX1 (power) "Dedicated SERDES pin. Receiver power supply.", C25 URC_SQ_VCCRX0 (power) "Dedicated SERDES pin. Receiver power supply.", G19 R_VCCPLL (power) "PLL Supply Voltage.", H7 L_VCCPLL (power) "PLL Supply Voltage.", J11 VCCAUX (power) "Dedicated auxiliary power supply pin.", J12 VCCAUX (power) "Dedicated auxiliary power supply pin.", J15 VCCAUX (power) "Dedicated auxiliary power supply pin.", J16 VCCAUX (power) "Dedicated auxiliary power supply pin.", J17 R_VCCPLL (power) "PLL Supply Voltage.", K6 L_VCCPLL (power) "PLL Supply Voltage.", L9 VCCAUX (power) "Dedicated auxiliary power supply pin.", L12 VCC (power) "Dedicated core logic power supply pin.", L13 VCC (power) "Dedicated core logic power supply pin.", L14 VCC (power) "Dedicated core logic power supply pin.", L15 VCC (power) "Dedicated core logic power supply pin.", L18 VCCAUX (power) "Dedicated auxiliary power supply pin.", M9 VCCAUX (power) "Dedicated auxiliary power supply pin.", M11 VCC (power) "Dedicated core logic power supply pin.", M12 VCC (power) "Dedicated core logic power supply pin.", M15 VCC (power) "Dedicated core logic power supply pin.", M16 VCC (power) "Dedicated core logic power supply pin.", M18 VCCAUX (power) "Dedicated auxiliary power supply pin.", N11 VCC (power) "Dedicated core logic power supply pin.", N16 VCC (power) "Dedicated core logic power supply pin.", P7 L_VCCPLL (power) "PLL Supply Voltage.", P11 VCC (power) "Dedicated core logic power supply pin.", P16 VCC (power) "Dedicated core logic power supply pin.", P20 R_VCCPLL (power) "PLL Supply Voltage.", R8 L_VCCPLL (power) "PLL Supply Voltage.", R9 VCCAUX (power) "Dedicated auxiliary power supply pin.", R11 VCC (power) "Dedicated core logic power supply pin.", R12 VCC (power) "Dedicated core logic power supply pin.", R15 VCC (power) "Dedicated core logic power supply pin.", R16 VCC (power) "Dedicated core logic power supply pin.", R18 VCCAUX (power) "Dedicated auxiliary power supply pin.", T9 VCCAUX (power) "Dedicated auxiliary power supply pin.", T12 VCC (power) "Dedicated core logic power supply pin.", T13 VCC (power) "Dedicated core logic power supply pin.", T14 VCC (power) "Dedicated core logic power supply pin.", T15 VCC (power) "Dedicated core logic power supply pin.", T18 VCCAUX (power) "Dedicated auxiliary power supply pin.", V11 VCCAUX (power) "Dedicated auxiliary power supply pin.", V12 VCCAUX (power) "Dedicated auxiliary power supply pin.", V15 VCCAUX (power) "Dedicated auxiliary power supply pin.", V16 VCCAUX (power) "Dedicated auxiliary power supply pin.", V18 R_VCCPLL (power) "PLL Supply Voltage."
part N pins: A2 GND (power) "Dedicated ground pin.", A13 GND (power) "Dedicated ground pin.", A19 GND (power) "Dedicated ground pin.", A25 GND (power) "Dedicated ground pin.", AA2 GND (power) "Dedicated ground pin.", AA25 GND (power) "Dedicated ground pin.", AB5 GND (power) "Dedicated ground pin.", AB9 GND (power) "Dedicated ground pin.", AB18 GND (power) "Dedicated ground pin.", AB22 GND (power) "Dedicated ground pin.", AE1 GND (power) "Dedicated ground pin.", AE6 GND (power) "Dedicated ground pin.", AE11 GND (power) "Dedicated ground pin.", AE16 GND (power) "Dedicated ground pin.", AE22 GND (power) "Dedicated ground pin.", AE26 GND (power) "Dedicated ground pin.", AF2 GND (power) "Dedicated ground pin.", AF13 GND (power) "Dedicated ground pin.", AF19 GND (power) "Dedicated ground pin.", AF25 GND (power) "Dedicated ground pin.", B1 GND (power) "Dedicated ground pin.", B6 GND (power) "Dedicated ground pin.", B11 GND (power) "Dedicated ground pin.", B16 GND (power) "Dedicated ground pin.", B22 GND (power) "Dedicated ground pin.", B26 GND (power) "Dedicated ground pin.", E5 GND (power) "Dedicated ground pin.", E9 GND (power) "Dedicated ground pin.", E18 GND (power) "Dedicated ground pin.", E22 GND (power) "Dedicated ground pin.", F2 GND (power) "Dedicated ground pin.", F25 GND (power) "Dedicated ground pin.", G11 GND (power) "Dedicated ground pin.", G16 GND (power) "Dedicated ground pin.", J5 GND (power) "Dedicated ground pin.", J22 GND (power) "Dedicated ground pin.", K11 GND (power) "Dedicated ground pin.", K13 GND (power) "Dedicated ground pin.", K14 GND (power) "Dedicated ground pin.", K16 GND (power) "Dedicated ground pin.", L2 GND (power) "Dedicated ground pin.", L7 GND (power) "Dedicated ground pin.", L10 GND (power) "Dedicated ground pin.", L11 GND (power) "Dedicated ground pin.", L16 GND (power) "Dedicated ground pin.", L17 GND (power) "Dedicated ground pin.", L20 GND (power) "Dedicated ground pin.", L25 GND (power) "Dedicated ground pin.", M13 GND (power) "Dedicated ground pin.", M14 GND (power) "Dedicated ground pin.", N10 GND (power) "Dedicated ground pin.", N12 GND (power) "Dedicated ground pin.", N13 GND (power) "Dedicated ground pin.", N14 GND (power) "Dedicated ground pin.", N15 GND (power) "Dedicated ground pin.", N17 GND (power) "Dedicated ground pin.", P10 GND (power) "Dedicated ground pin.", P12 GND (power) "Dedicated ground pin.", P13 GND (power) "Dedicated ground pin.", P14 GND (power) "Dedicated ground pin.", P15 GND (power) "Dedicated ground pin.", P17 GND (power) "Dedicated ground pin.", R13 GND (power) "Dedicated ground pin.", R14 GND (power) "Dedicated ground pin.", T2 GND (power) "Dedicated ground pin.", T7 GND (power) "Dedicated ground pin.", T10 GND (power) "Dedicated ground pin.", T11 GND (power) "Dedicated ground pin.", T16 GND (power) "Dedicated ground pin.", T17 GND (power) "Dedicated ground pin.", T20 GND (power) "Dedicated ground pin.", T25 GND (power) "Dedicated ground pin.", U11 GND (power) "Dedicated ground pin.", U13 GND (power) "Dedicated ground pin.", U14 GND (power) "Dedicated ground pin.", U16 GND (power) "Dedicated ground pin.", V5 GND (power) "Dedicated ground pin.", V22 GND (power) "Dedicated ground pin.", Y11 GND (power) "Dedicated ground pin.", Y16 GND (power) "Dedicated ground pin."
part O pins: AB3 NC "Not Connected", AB4 NC "Not Connected", AC1 NC "Not Connected", AC2 NC "Not Connected", AD15 NC "Not Connected", AD18 NC "Not Connected", AD20 NC "Not Connected", AD23 NC "Not Connected", AE13 NC "Not Connected", AE25 NC "Not Connected", AF16 NC "Not Connected", AF22 NC "Not Connected", B4 NC "Not Connected", B5 NC "Not Connected", C26 NC "Not Connected", D20 NC "Not Connected", D21 NC "Not Connected", D22 NC "Not Connected", D23 NC "Not Connected", D24 NC "Not Connected", D25 NC "Not Connected", D26 NC "Not Connected", E20 NC "Not Connected", E21 NC "Not Connected", E25 NC "Not Connected", E26 NC "Not Connected", F20 NC "Not Connected", G20 NC "Not Connected", K10 NC "Not Connected", K17 NC "Not Connected", N7 NC "Not Connected", R4 NC "Not Connected", U10 NC "Not Connected", U23 NC "Not Connected", V7 NC "Not Connected", V10 NC "Not Connected", W7 NC "Not Connected"
part A text: BANK 0
part B text: BANK 1
part C text: BANK 2
part D text: BANK 3
part E text: BANK 4
part F text: BANK 5
part G text: BANK 6
part H text: BANK 7
part I text: BANK 8

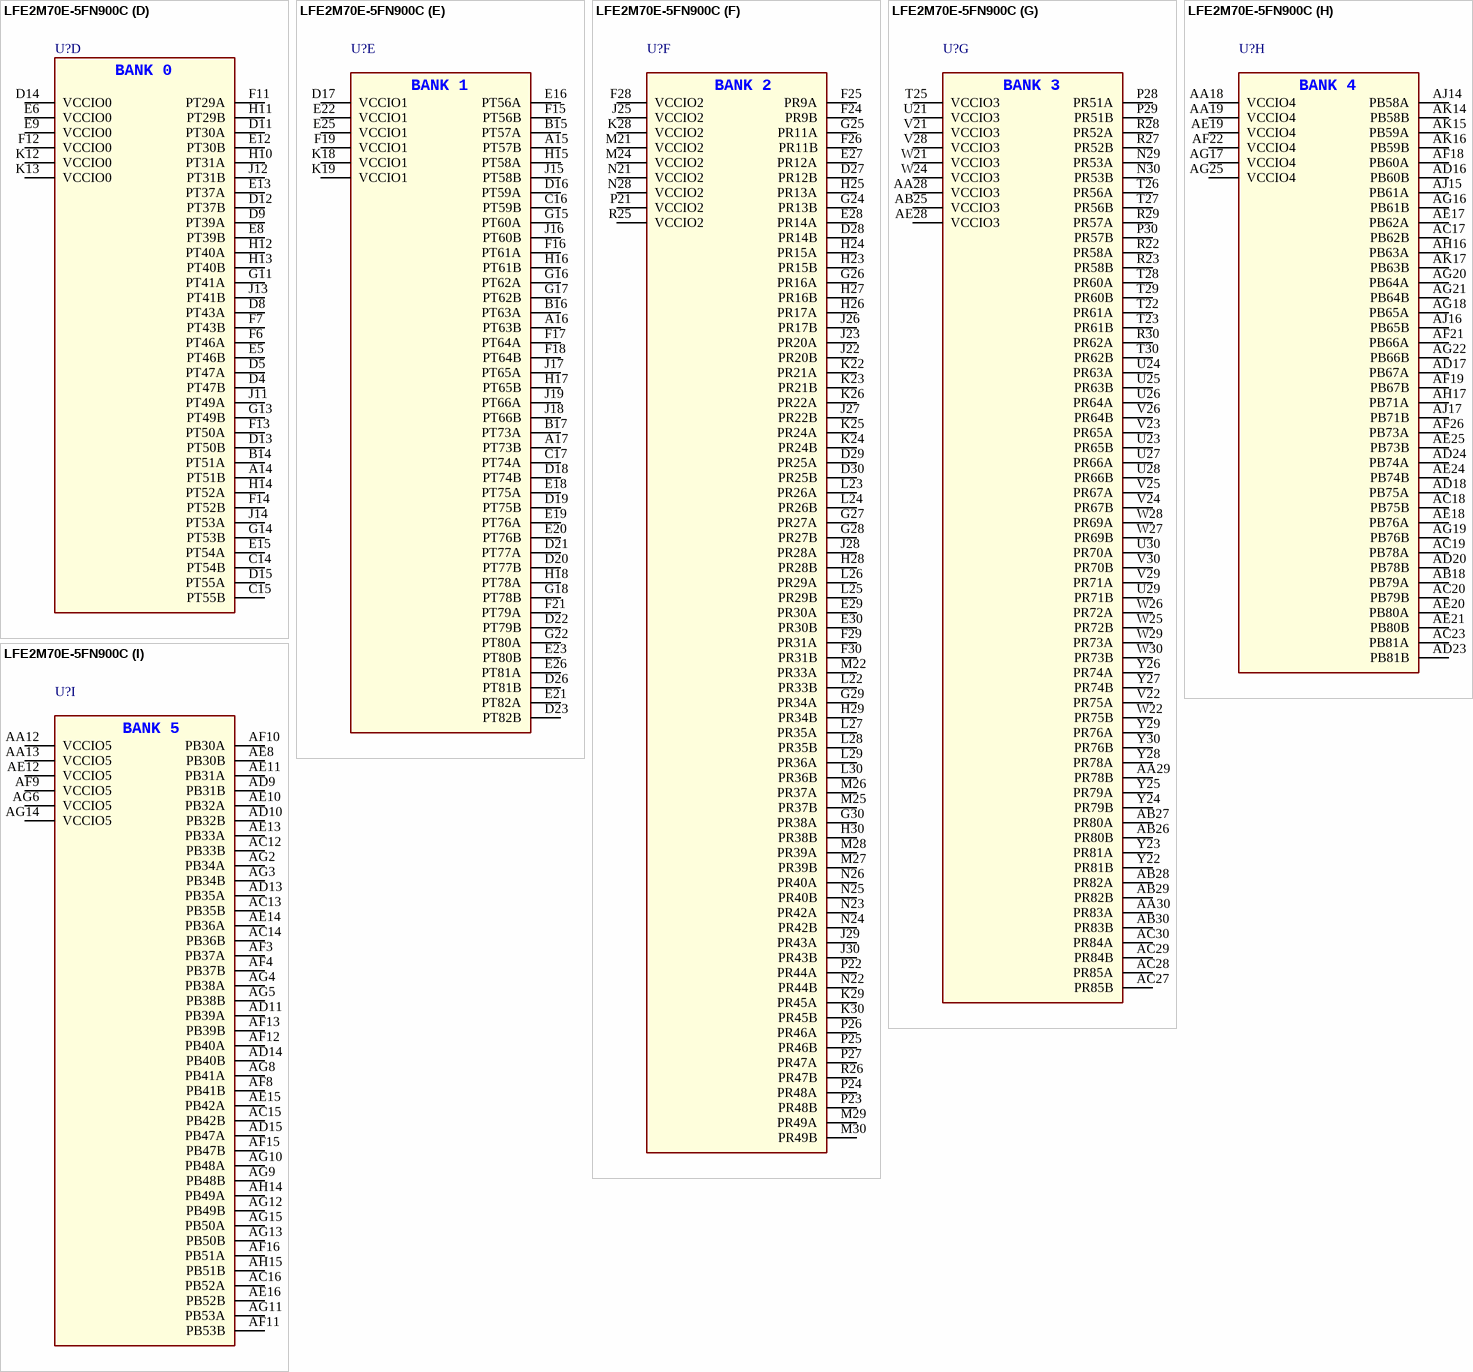
[diagram p18: symbol LFE2M70E-5FN900C]

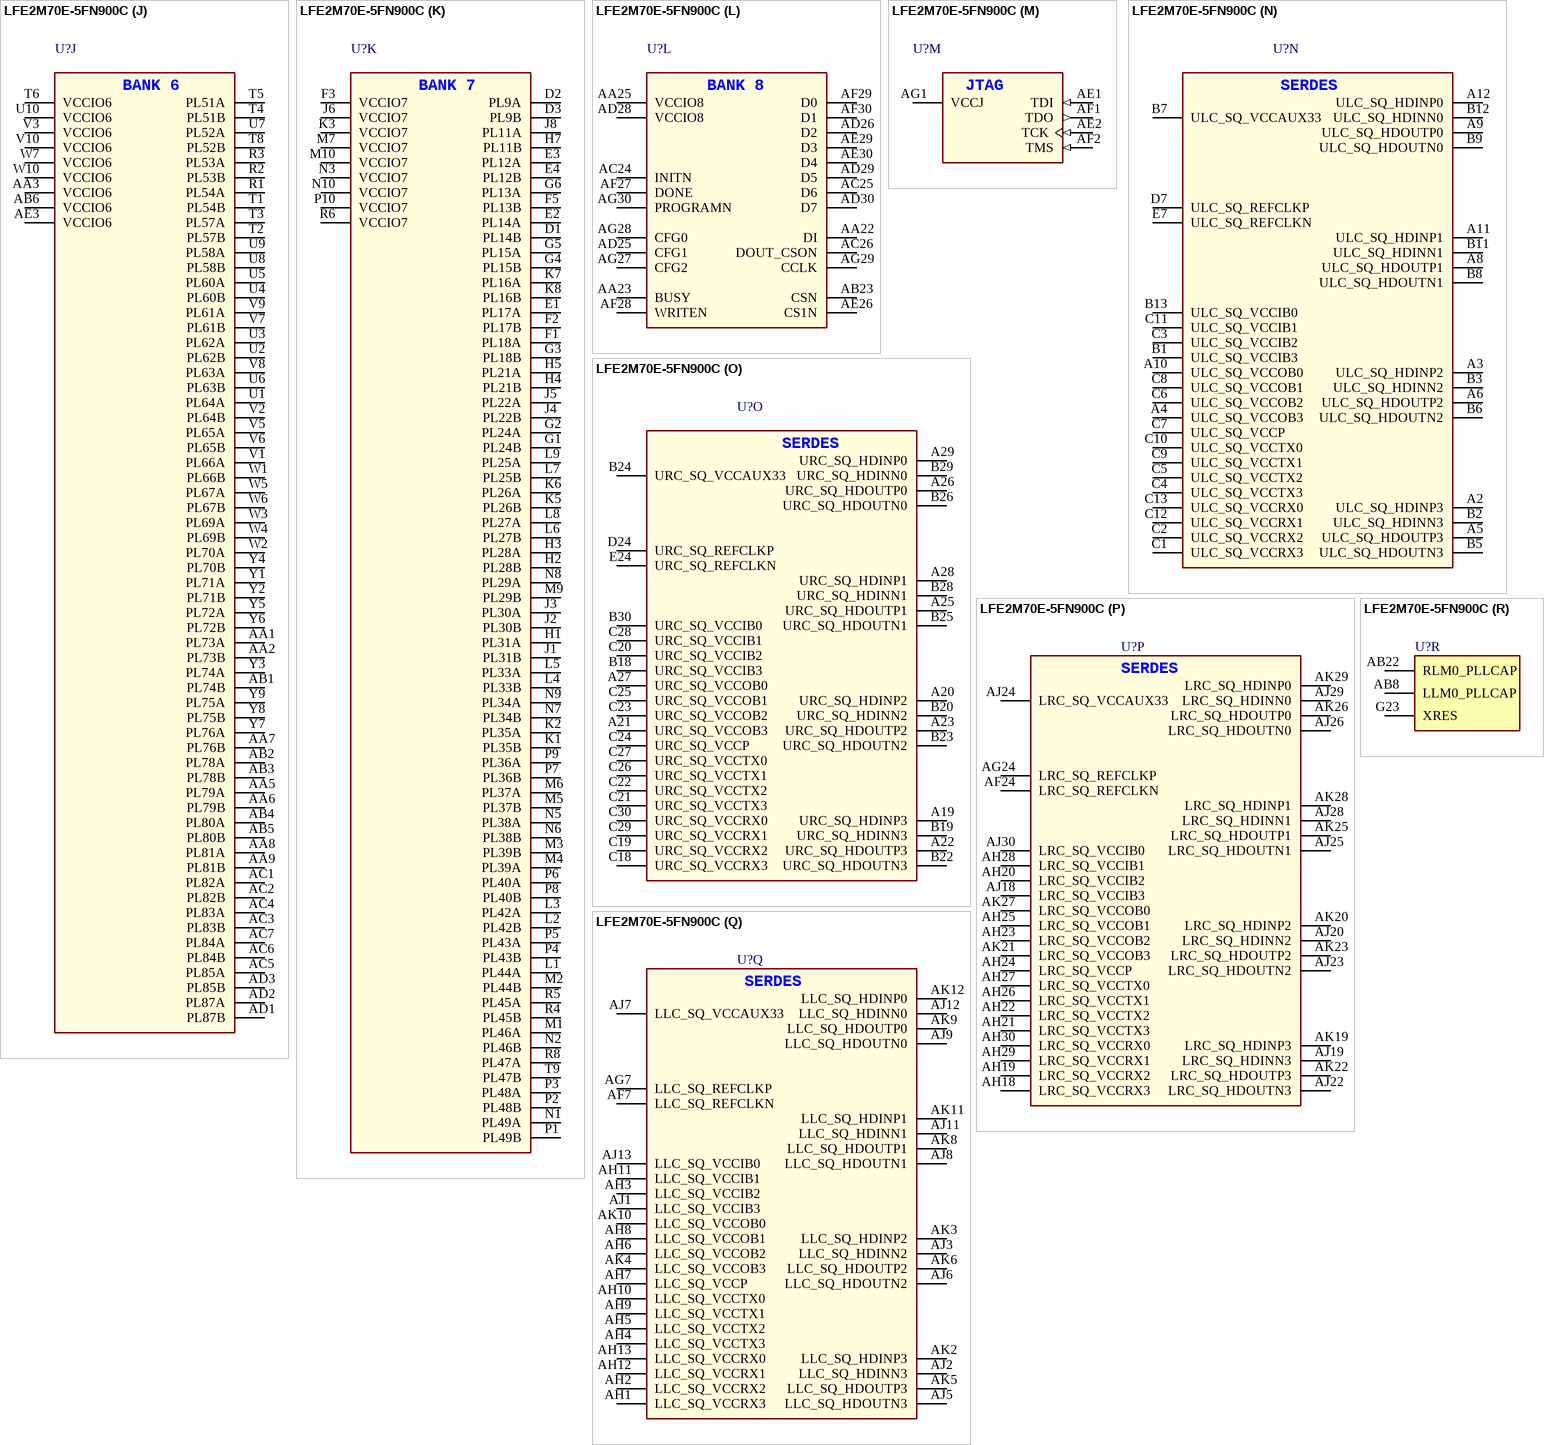
[diagram p19: symbol LFE2M70E-5FN900C]